# Altium footprint library Horizont_11_12_2017.PcbLib: 257 footprints (part 5 of 17)
Each footprint in its own frame and in the unit in brackets; x right, y up, seen from the top. Pads: shape width x height; smd on the part's side, far side on the other; paste and mask are expansions set on the pad; w line width, h text height; cw(c..) or ccw(c..) is an arc to the next point about the centre after c.
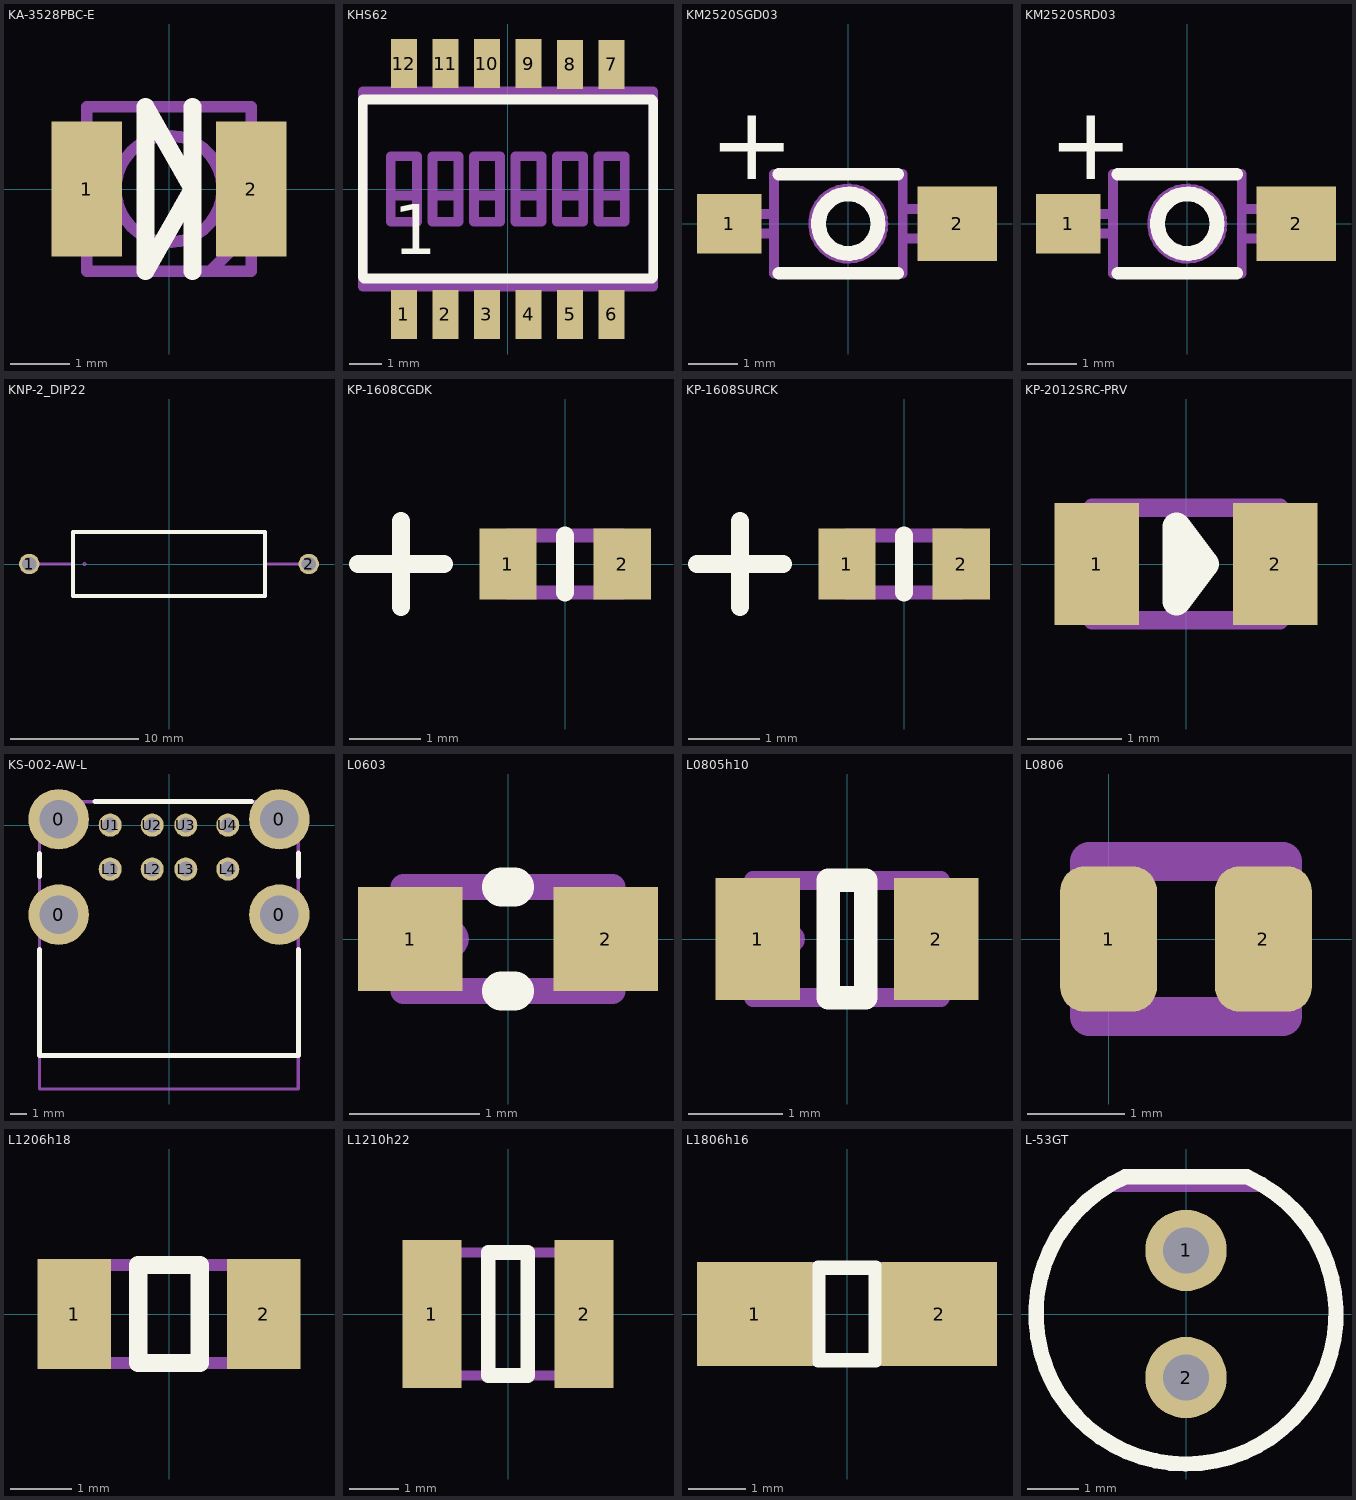
[diagram p4: the footprints below, top view; thin cyan lines are the x and y axes]

## KA-3528PBC-E [mm]
height 1
pads (2):
  rect 1.2x2.3 smd: 1(-1.4,0) 2(1.4,0)
Top Overlay:
  lines w0.3: 0.4,-1.4 0.4,1.4 ; -0.4,-1.4 0.4,0 -0.4,1.4 -0.4,-1.4
Mechanical 1:
  circle w0.2: c0,0 r0.906
  lines w0.2: -1.4,-0.8 -1.8,-0.8 -1.8,0.8 -1.4,0.8 ; 0.7,-1.4 1.4,-0.7 ; 1.4,-0.8 1.8,-0.8 1.8,0.8 1.4,0.8 ; -1.4,-1.4 1.4,-1.4 1.4,1.4 -1.4,1.4 -1.4,-1.4
  text "+" at -2.2,1.2 h1.5
  text ".Designator" at -1.3,1.8 h1.5
3D body "KA-3528PBC-E.stp": height 1.9, standoff 0, extent -1.75,-1.4 1.75,1.4

## KHS62 [mm]
height 1.7
pads (12):
  rect 0.8x1.5 smd: 1(-3.175,-3.835) 2(-1.905,-3.835) 3(-0.635,-3.835) 4(0.635,-3.835) 5(1.905,-3.835) 6(3.175,-3.835) 7(3.175,3.81) 8(1.905,3.81) 9(0.635,3.835) 10(-0.635,3.835) 11(-1.905,3.835) 12(-3.175,3.835)
Top Overlay:
  lines w0.3: -4.43,-2.7 -4.395,-2.735 4.41,-2.735 4.445,-2.7 4.445,2.7 4.41,2.735 -4.43,2.735 -4.43,-2.7
  text "1" at -3.5,-2 h1.52
Mechanical 1:
  lines w0.3: -3.575,-0.2 -2.775,-0.2 ; -3.375,-2.985 -3.375,-4.085 -2.975,-4.085 -2.975,-2.985 ; -3.375,2.985 -3.375,4.085 -2.975,4.085 -2.975,2.985 ; -2.305,-0.2 -1.505,-0.2 ; -2.105,-2.985 -2.105,-4.085 -1.705,-4.085 -1.705,-2.985 ; -2.105,2.985 -2.105,4.085 -1.705,4.085 -1.705,2.985 ; -1.035,-0.2 -0.235,-0.2 ; -0.835,-2.985 -0.835,-4.085 -0.435,-4.085 -0.435,-2.985 ; -0.835,2.985 -0.835,4.085 -0.435,4.085 -0.435,2.985 ; 0.235,-0.2 1.035,-0.2 ; 0.435,-2.985 0.435,-4.085 0.835,-4.085 0.835,-2.985 ; 0.435,2.985 0.435,4.085 0.835,4.085 0.835,2.985 ; 1.505,-0.2 2.305,-0.2 ; 1.705,-2.985 1.705,-4.085 2.105,-4.085 2.105,-2.985 ; 1.705,2.985 1.705,4.085 2.105,4.085 2.105,2.985 ; 2.775,-0.2 3.575,-0.2 ; 2.975,-2.985 2.975,-4.085 3.375,-4.085 3.375,-2.985 ; 2.975,2.985 2.975,4.085 3.375,4.085 3.375,2.985 ; -4.43,-2.985 4.445,-2.985 4.445,2.985 -4.43,2.985 -4.43,-2.985 ; -3.575,-1 -2.775,-1 -2.775,1 -3.575,1 -3.575,-1 ; -2.305,-1 -1.505,-1 -1.505,1 -2.305,1 -2.305,-1 ; -1.035,-1 -0.235,-1 -0.235,1 -1.035,1 -1.035,-1 ; 0.235,-1 1.035,-1 1.035,1 0.235,1 0.235,-1 ; 1.505,-1 2.305,-1 2.305,1 1.505,1 1.505,-1 ; 2.775,-1 3.575,-1 3.575,1 2.775,1 2.775,-1
  text "6" at 3.048,-2.286 h1.5
  text "1" at -3.429,-2.413 h1.5
  text ".Designator" at -1.726,1.5 h1.5
3D body "KHS62.STEP": height 1.7, standoff 0, extent -4.375,-4.06 4.375,4.06

## KM2520SGD03 [mm]
height 2.9
pads (2):
  rect 1.3x1.2 smd: 1(-2.4,0)
  rect 1.6x1.5 smd: 2(2.2,0)
Top Overlay:
  circle w0.3: c0,0 r0.6
  lines w0.25: -1.4,-1 1,-1 ; -1.4,1 1,1
  text "+" at -2.8,0.9 h1.5
Mechanical 1:
  circle w0.2: c0,0 r0.707
  lines w0.2: -1.5,-0.2 -2.5,-0.2 -2.5,0.2 -1.5,0.2 ; 1.1,-0.3 2.5,-0.3 2.5,0.3 1.1,0.3 ; -1.5,-1 -1.5,1 1.1,1 1.1,-1 -1.5,-1
  text ".Designator" at -1.2,1.6 h1.5
  text "+" at -2.5,0.5 h1.5
3D body "KM2520SGD03.stp": height 2.9, standoff 0, extent -2.5,-1.05 2.5,1.05

## KM2520SRD03 [mm]
height 2.9
pads (2):
  rect 1.3x1.2 smd: 1(-2.4,0)
  rect 1.6x1.5 smd: 2(2.2,0)
Top Overlay:
  circle w0.3: c0,0 r0.6
  lines w0.25: -1.4,-1 1,-1 ; -1.4,1 1,1
  text "+" at -2.8,0.9 h1.5
Mechanical 1:
  circle w0.2: c0,0 r0.707
  lines w0.2: -1.5,-0.2 -2.5,-0.2 -2.5,0.2 -1.5,0.2 ; 1.1,-0.3 2.5,-0.3 2.5,0.3 1.1,0.3 ; -1.5,-1 1.1,-1 1.1,1 -1.5,1 -1.5,-1
  text "+" at -2.5,0.5 h1.5
  text ".Designator" at -1.2,1.6 h1.5
3D body "KM2520SRD03.stp": height 2.9, standoff 0, extent -2.5,-1.05 2.5,1.05

## KNP-2_DIP22 [mm]
height 5
pads (2):
  round 1.6 hole 1.1: 1(-10.922,0) 2(10.922,0)
Top Overlay:
  lines w0.3: -7.5,-2.5 7.5,-2.5 7.5,2.5 -7.5,2.5 -7.5,-2.5
Mechanical 1:
  circle w0.1: c-6.6,0 r0.1
  lines w0.2: -11,0 -7.5,0 ; 7.5,0 11,0 ; -7.5,-2.5 -7.5,2.5 7.5,2.5 7.5,-2.5 -7.5,-2.5
  text ".Designator" at -2.5,0 h1.5
3D body "KNP-2.STEP": height 5, standoff -2.5, extent -11.4,-2.5 11.4,2.5

## KP-1608CGDK [mm]
height 1.1
pads (2):
  rect 0.8x1 smd: 1(-0.8,0) 2(0.8,0)
Top Overlay:
  lines w0.25: 0,-0.4 0,0.4
  lines w0.254: -2.9,0 -1.7,0 ; -2.3,-0.6 -2.3,0.6
Mechanical 1:
  lines w0.2: -0.8,-0.4 0.8,-0.4 0.8,0.4 -0.8,0.4 -0.8,-0.4
  text "+" at -1.729,-1.438 h1.41
  text ".Designator" at -0.9,1 h1.5
3D body "kp-1608SGC.STEP": height 1.1, standoff 0, extent -0.8,-0.4 0.8,0.4

## KP-1608SURCK [mm]
height 1.1
pads (2):
  rect 0.8x1 smd: 1(-0.8,0) 2(0.8,0)
Top Overlay:
  lines w0.25: 0,-0.4 0,0.4
  lines w0.254: -2.9,0 -1.7,0 ; -2.3,-0.6 -2.3,0.6
Mechanical 1:
  lines w0.2: -0.8,-0.4 0.8,-0.4 0.8,0.4 -0.8,0.4 -0.8,-0.4
  text "+" at -1.729,-1.438 h1.41
  text ".Designator" at -0.9,1 h1.5
3D body "kp-1608SURCK.STEP": height 1.1, standoff 0, extent -0.8,-0.4 0.8,0.4

## KP-2012SRC-PRV [mm]
height 1.1
pads (2):
  rect 0.9x1.3 smd: 1(-0.95,0) 2(0.95,0)
Top Overlay:
  lines w0.3: -0.1,-0.4 0.2,0 -0.1,0.4 -0.1,-0.4
Mechanical 1:
  lines w0.2: -1,-0.6 -1,0.6 1,0.6 1,-0.6 -1,-0.6
  text "+" at -2.1,-0.4 h1.5
  text ".Designator" at -0.7,1.1 h1.5
3D body "KP-2012SRC-PRV.stp": height 1, standoff 0, extent -1,-0.625 1,0.625

## KS-002-AW-L [mm]
height 16.2
pads (12):
  round 3.6 hole 2.3 mask+0.05: 0(-6.57,-5.33) 0(-6.57,0.35) 0(6.57,-5.33) 0(6.57,0.35)
  round 1.372 hole 0.9 mask+0.051: L1(-3.5,-2.62) L2(-1,-2.62) L3(1,-2.62) L4(3.5,-2.62) U1(-3.5,0) U2(-1,0) U3(1,0) U4(3.5,0)
Top Overlay:
  lines w0.3: -7.702,-7.4 -7.702,-13.7 7.698,-13.7 7.698,-7.4 ; -7.702,-3.05 -7.702,-1.7 ; -4.402,1.4 4.898,1.4 ; 7.698,-3.05 7.698,-1.65
Mechanical 1:
  lines w0.2: -7.702,-15.701 -7.702,1.4 7.698,1.4 7.698,-15.701 -7.702,-15.701
  text "U4" at 2.848,-0.48 h1.5
  text "U1" at -4.152,-0.48 h1.5
  text "L4" at 2.848,-3.1 h1.5
  text ".Designator" at -2.052,-8.6 h1.5
  text "L1" at -4.152,-3.1 h1.5
3D body "KS-002-AW-L.stp": height 17.13, standoff -3.2, extent -7.7,-15.7 7.7,1.4

## L0603 [mm]
height 0.9
pads (2):
  rect 0.8x0.8 smd: 1(-0.75,0) 2(0.75,0)
Top Overlay:
  lines w0.3: -0.05,-0.4 0.05,-0.4 ; -0.05,0.4 0.05,0.4
Mechanical 1:
  circle w0.1: c-0.45,0 r0.1
  lines w0.2: -0.8,-0.4 0.8,-0.4 0.8,0.4 -0.8,0.4 -0.8,-0.4
  text ".Designator" at -0.72,0.7 h1.5
3D body "C0603h09.stp": height 0.9, standoff 0, extent -0.85,-0.45 0.85,0.45

## L0805h10 [mm]
height 1
pads (2):
  rect 0.9x1.3 smd: 1(-0.95,0) 2(0.95,0)
Top Overlay:
  lines w0.25: -0.2,-0.625 -0.2,0.625 0.2,0.625 0.2,-0.625 -0.2,-0.625
Mechanical 1:
  circle w0.1: c-0.6,0 r0.1
  lines w0.2: -1,-0.625 1,-0.625 1,0.625 -1,0.625 -1,-0.625
  text ".Designator" at -0.87,0.95 h1.5
3D body "L0805h10.stp": height 1, standoff 0, extent -1.05,-0.675 1.05,0.675

## L0806 [mm]
pads (2):
  rrect50% 1x1.5 smd: 1(0,0) 2(1.6,0)
Mechanical 1:
  lines w0.4: -0.2,-0.8 1.8,-0.8 1.8,0.8 -0.2,0.8 -0.2,-0.8

## L1206h18 [mm]
height 1.8
pads (2):
  rect 1.2x1.8 smd: 1(-1.55,0) 2(1.55,0)
Top Overlay:
  lines w0.3: -0.5,-0.8 0.5,-0.8 0.5,0.8 -0.5,0.8 -0.5,-0.8
Mechanical 1:
  circle w0.1: c-1.15,0 r0.1
  lines w0.2: -1.6,-0.8 1.6,-0.8 1.6,0.8 -1.6,0.8 -1.6,-0.8
  text ".Designator" at -1.32,1.25 h1.5
3D body "L1206h18.stp": height 1.8, standoff 0, extent -1.675,-0.9 1.675,0.9

## L1210h22 [mm]
height 2.2
pads (2):
  rect 1.2x3 smd: 1(-1.55,0) 2(1.55,0)
Top Overlay:
  lines w0.3: -0.4,-1.25 -0.4,1.25 0.4,1.25 0.4,-1.25 -0.4,-1.25
Mechanical 1:
  circle w0.1: c-1.15,0 r0.1
  lines w0.2: -1.6,-1.25 -1.6,1.25 1.6,1.25 1.6,-1.25 -1.6,-1.25
  text ".Designator" at -1.22,-0.4 h1.5
3D body "L1210h22.stp": height 2.2, standoff 0, extent -1.675,-1.325 1.675,1.325

## L1806h16 [mm]
height 1.6
pads (2):
  rect 2x1.8 smd: 1(-1.6,0) 2(1.6,0)
Top Overlay:
  lines w0.25: -0.5,-0.8 0.5,-0.8 0.5,0.8 -0.5,0.8 -0.5,-0.8
Mechanical 1:
  circle w0.1: c-1.8,0 r0.1
  lines w0.2: -2.3,-0.8 2.3,-0.8 2.3,0.8 -2.3,0.8 -2.3,-0.8
  text ".Designator" at -1.2,1.3 h1.5
3D body "L1806h16.stp": height 1.6, standoff 0, extent -2.4,-0.9 2.4,0.9

## L-53GT [mm]
height 11
pads (2):
  round 1.6 hole 0.9 unplated: 1(0,1.25) 2(0,-1.25)
Top Overlay:
  lines w0.3: -1.2,2.7 1.2,2.7 ; -1.198,2.696 ccw(c0,0) 1.217,2.687
Mechanical 1:
  lines w0.2: -1.608,2.473 ccw(c0,0) 1.608,2.473 ; -1.608,2.5 1.608,2.5
  text "+" at -0.4,-1.7 h1.5
  text ".Designator" at -3.2,3.55 h1.5
3D body "L-53GT.stp": height 11.2, standoff -3, extent -2.949,-2.95 2.949,2.5